# Altium footprint library Active.PcbLib: 325 footprints (part 19 of 23)
Each footprint in its own frame and in the unit in brackets; x right, y up, seen from the top. Pads: shape width x height; smd on the part's side, far side on the other; paste and mask are expansions set on the pad; w line width, h text height; cw(c..) or ccw(c..) is an arc to the next point about the centre after c.
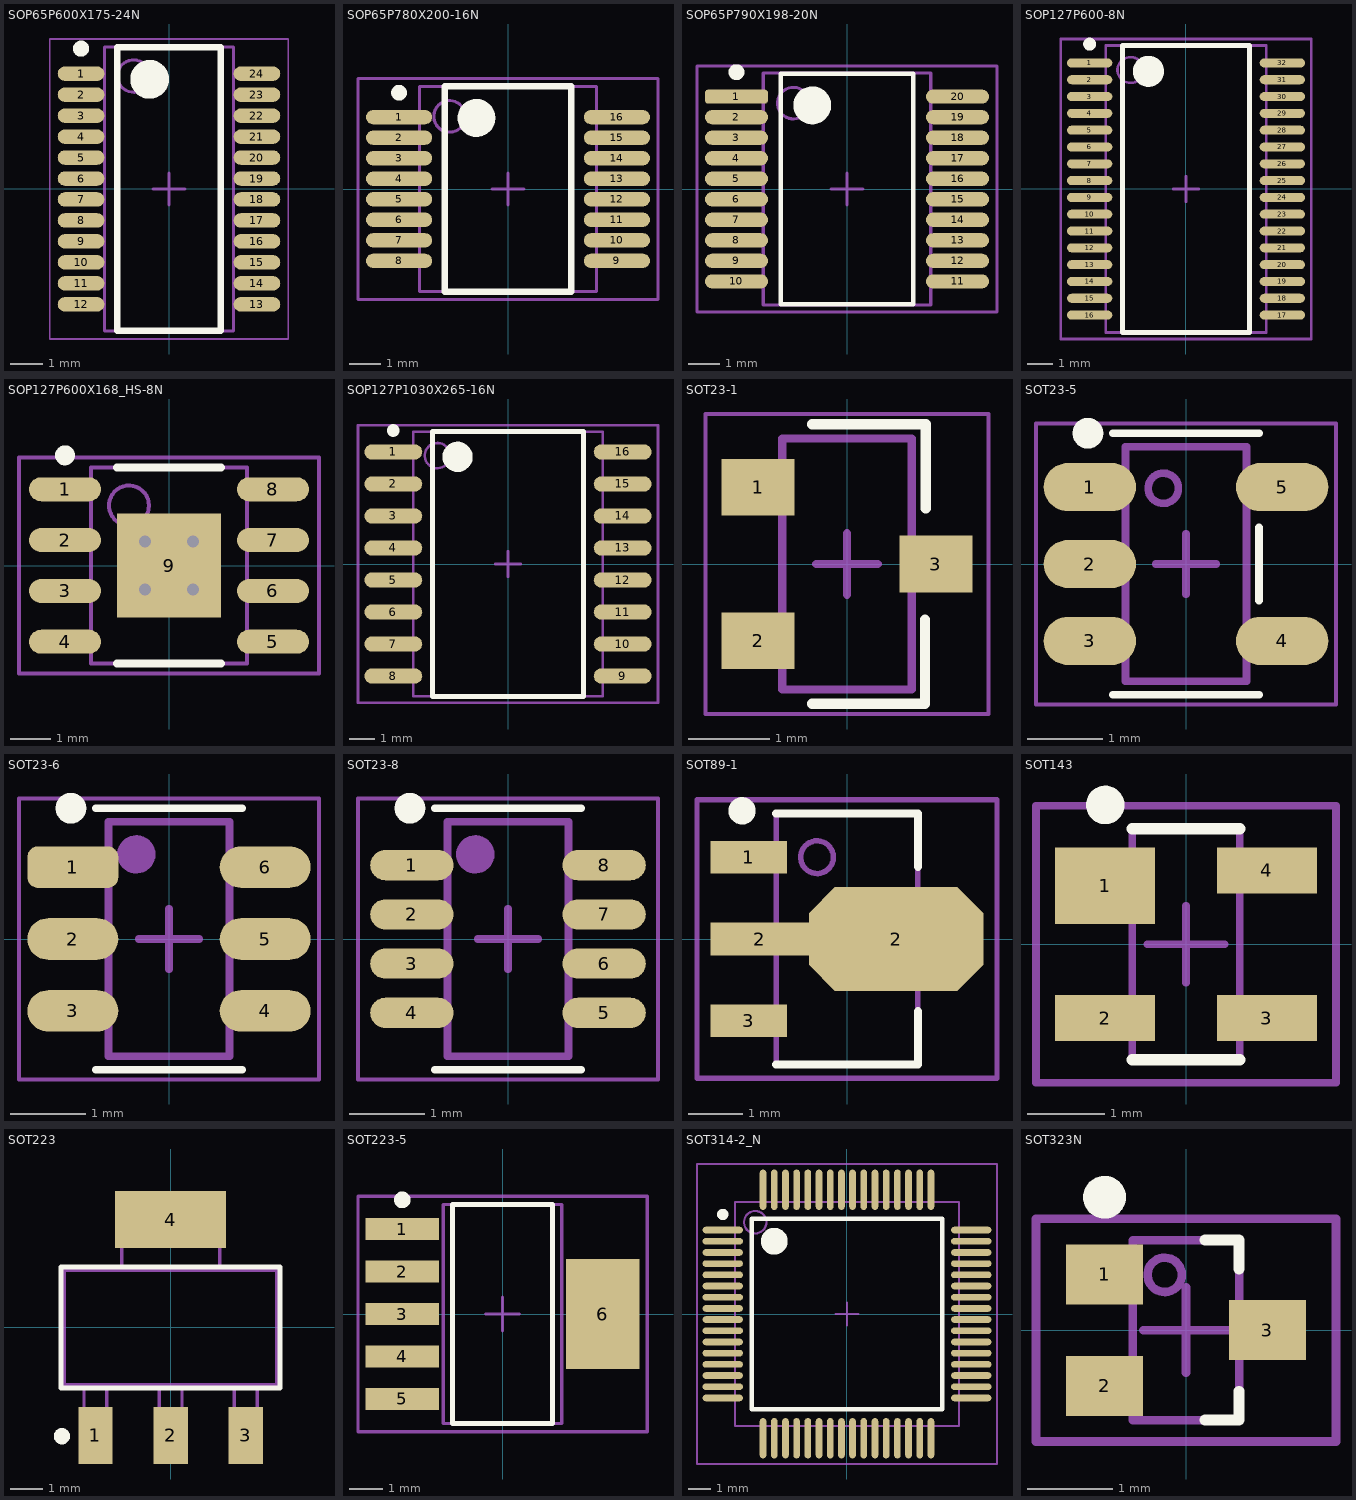
[diagram p18: the footprints below, top view; thin cyan lines are the x and y axes]

## SOP65P600X175-24N [mm] "SOP, 24-Leads, Body 8.65x3.90mm, Pitch 0.65mm, IPC Medium Density"
height 1.75
pads (24):
  oval 1.45x0.45 smd mask+0.05: 1(-2.725,3.575) 2(-2.725,2.925) 3(-2.725,2.275) 4(-2.725,1.625) 5(-2.725,0.975) 6(-2.725,0.325) 7(-2.725,-0.325) 8(-2.725,-0.975) 9(-2.725,-1.625) 10(-2.725,-2.275) 11(-2.725,-2.925) 12(-2.725,-3.575) 13(2.725,-3.575) 14(2.725,-2.925) 15(2.725,-2.275) 16(2.725,-1.625) 17(2.725,-0.975) 18(2.725,-0.325) 19(2.725,0.325) 20(2.725,0.975) 21(2.725,1.625) 22(2.725,2.275) 23(2.725,2.925) 24(2.725,3.575)
Top Overlay:
  circle w0.25: c-2.725,4.35 r0.125
  circle w0.6: c-0.6,3.4 r0.3
  lines w0.2: -1.6,-4.4 -1.6,4.4 1.6,4.4 1.6,-4.4 -1.6,-4.4
Mechanical 13:
  circle w0.1: c-1.1,3.5 r0.5
  lines w0.1: -2,-4.4 -2,4.4 2,4.4 2,-4.4 -2,-4.4
Mechanical 15:
  lines w0.05: -3.7,-4.65 -3.7,4.65 3.7,4.65 3.7,-4.65 -3.7,-4.65
  lines w0.1: -0.5,0 0.5,0 ; 0,-0.5 0,0.5
3D body: height 1.75, standoff 0.1, extent -2,-4.4 2,4.4
3D body: height 1.76, standoff 1.75, extent -1.599,3 -0.6,4

## SOP65P780X200-16N [mm] "SOP, 16-Leads, Body 6,5x5,6mm (max), Pitch 0,65mm, IPC Medium Density"
height 2
pads (16):
  oval 2.1x0.45 smd mask+0.051: 1(-3.45,2.275) 2(-3.45,1.625) 3(-3.45,0.975) 4(-3.45,0.325) 5(-3.45,-0.325) 6(-3.45,-0.975) 7(-3.45,-1.625) 8(-3.45,-2.275) 9(3.45,-2.275) 10(3.45,-1.625) 11(3.45,-0.975) 12(3.45,-0.325) 13(3.45,0.325) 14(3.45,0.975) 15(3.45,1.625) 16(3.45,2.275)
Top Overlay:
  circle w0.6: c-1,2.25 r0.3
  circle w0.25: c-3.45,3.05 r0.125
  lines w0.2: -2,-3.25 2,-3.25 2,3.25 -2,3.25 -2,-3.25
Mechanical 13:
  circle w0.1: c-1.85,2.3 r0.5
  lines w0.1: -2.8,-3.25 2.8,-3.25 2.8,3.25 -2.8,3.25 -2.8,-3.25
Mechanical 15:
  lines w0.1: -0.5,0 0.5,0 ; 0,-0.5 0,0.5 ; -4.75,-3.5 4.75,-3.5 4.75,3.5 -4.75,3.5 -4.75,-3.5
3D body: height 2, standoff 0.05, extent -2.8,-3.25 2.8,3.25

## SOP65P790X198-20N [mm] "SOP, 20-Leads, Body 7,3x5,3mm (max), Pitch 0,65mm, IPC Medium Density"
height 1.98
pads (20):
  rrect50% 2x0.45 smd mask+0.051: 1(-3.5,2.925)
  oval 2x0.45 smd mask+0.051: 2(-3.5,2.275) 3(-3.5,1.625) 4(-3.5,0.975) 5(-3.5,0.325) 6(-3.5,-0.325) 7(-3.5,-0.975) 8(-3.5,-1.625) 9(-3.5,-2.275) 10(-3.5,-2.925) 11(3.5,-2.925) 12(3.5,-2.275) 13(3.5,-1.625) 14(3.5,-0.975) 15(3.5,-0.325) 16(3.5,0.325) 17(3.5,0.975) 18(3.5,1.625) 19(3.5,2.275) 20(3.5,2.925)
Top Overlay:
  circle w0.6: c-1.1,2.65 r0.3
  circle w0.25: c-3.5,3.7 r0.125
  lines w0.15: -2.1,-3.65 2.1,-3.65 2.1,3.65 -2.1,3.65 -2.1,-3.65
Mechanical 13:
  circle w0.1: c-1.7,2.72 r0.5
  lines w0.1: -2.65,-3.67 2.65,-3.67 2.65,3.67 -2.65,3.67 -2.65,-3.67
Mechanical 15:
  lines w0.1: -0.5,0 0.5,0 ; 0,-0.5 0,0.5 ; -4.75,-3.9 4.75,-3.9 4.75,3.9 -4.75,3.9 -4.75,-3.9
3D body: height 1.98, standoff 0.15, extent -2.65,-3.67 2.65,3.67

## SOP127P600-8N [mm]
height 1.2
pads (32):
  oval 1.75x0.35 smd mask+0.051: 1(-3.725,4.875) 2(-3.725,4.225) 3(-3.725,3.575) 4(-3.725,2.925) 5(-3.725,2.275) 6(-3.725,1.625) 7(-3.725,0.975) 8(-3.725,0.325) 9(-3.725,-0.325) 10(-3.725,-0.975) 11(-3.725,-1.625) 12(-3.725,-2.275) 13(-3.725,-2.925) 14(-3.725,-3.575) 15(-3.725,-4.225) 16(-3.725,-4.875) 17(3.725,-4.875) 18(3.725,-4.225) 19(3.725,-3.575) 20(3.725,-2.925) 21(3.725,-2.275) 22(3.725,-1.625) 23(3.725,-0.975) 24(3.725,-0.325) 25(3.725,0.325) 26(3.725,0.975) 27(3.725,1.625) 28(3.725,2.275) 29(3.725,2.925) 30(3.725,3.575) 31(3.725,4.225) 32(3.725,4.875)
Top Overlay:
  circle w0.6: c-1.45,4.55 r0.3
  circle w0.25: c-3.725,5.6 r0.125
  lines w0.2: -2.45,-5.55 2.45,-5.55 2.45,5.55 -2.45,5.55 -2.45,-5.55
Mechanical 13:
  circle w0.1: c-2.15,4.6 r0.5
  lines w0.1: -3.1,-5.55 3.1,-5.55 3.1,5.55 -3.1,5.55 -3.1,-5.55
Mechanical 15:
  lines w0.1: -0.5,0 0.5,0 ; 0,-0.5 0,0.5 ; -4.85,-5.8 4.85,-5.8 4.85,5.8 -4.85,5.8 -4.85,-5.8
3D body: height 1.2, standoff 0.1, extent -3.1,-5.55 3.1,5.55

## SOP127P600X168_HS-8N [mm] "SOP, 8-Leads, Body 4,9x3,9mm (max), Pitch 1,27mm, IPC Medium Density"
height 1.68
pads (9):
  oval 1.8x0.6 smd mask+0.076: 1(-2.6,1.905) 2(-2.6,0.635) 3(-2.6,-0.635) 4(-2.6,-1.905) 5(2.6,-1.905) 6(2.6,-0.635) 7(2.6,0.635) 8(2.6,1.905)
  rect 2.6x2.6 smd paste-7 mask-7: 9(0,0)
via 0.6,-0.6 diameter 0.65 hole 0.3
via -0.6,-0.6 diameter 0.65 hole 0.3
via 0.6,0.6 diameter 0.65 hole 0.3
via -0.6,0.6 diameter 0.65 hole 0.3
Top Overlay:
  circle w0.25: c-2.6,2.755 r0.125
  lines w0.2: -1.3,-2.45 1.3,-2.45 ; -1.3,2.45 1.3,2.45
Top Paste:
  region: -0.525,0.275 -0.525,-0.275 -0.275,-0.525 0.275,-0.525 0.275,-0.5 0.5,-0.275 0.5,0.275 0.275,0.5 -0.3,0.5
  region: -1.3,-0.5 -0.925,-0.5 -0.7,-0.275 -0.7,0.275 -0.925,0.5 -1.3,0.5
  region: 1.3,-0.5 0.925,-0.5 0.7,-0.275 0.7,0.275 0.925,0.5 1.3,0.5
  region: -0.5,-1.3 -0.5,-0.925 -0.275,-0.7 0.275,-0.7 0.5,-0.925 0.5,-1.3
  region: -0.5,1.3 -0.5,0.925 -0.275,0.7 0.275,0.7 0.5,0.925 0.5,1.3
  region: -1.3,-1.3 -0.675,-1.3 -0.675,-0.925 -0.95,-0.65 -1.3,-0.65
  region: 1.3,-1.3 0.675,-1.3 0.675,-0.925 0.95,-0.65 1.3,-0.65
  region: 1.3,1.3 0.675,1.3 0.675,0.925 0.95,0.65 1.3,0.65
  region: -1.3,1.3 -0.675,1.3 -0.675,0.925 -0.95,0.65 -1.3,0.65
Top Solder:
  circle w0.102: c-0.6,0.6 r0.406
  circle w0.102: c0.6,0.6 r0.406
  circle w0.102: c-0.6,-0.6 r0.406
  circle w0.102: c0.6,-0.6 r0.406
  region: -1.346,-1.397 0,-1.397 0,0 -0.635,0 -0.635,-0.203 -0.483,-0.203 -0.457,-0.229 -0.381,-0.229 -0.305,-0.305 -0.305,-0.356 -0.194,-0.467 -0.194,-0.727 -0.279,-0.813 -0.279,-0.838 -0.432,-0.991 -0.559,-0.991 -0.584,-1.016 -0.61,-0.991 -0.787,-0.991 -0.94,-0.838 -0.965,-0.838 -0.965,-0.711 -0.991,-0.686 -0.991,-0.432 -0.914,-0.356 -0.914,-0.33 -0.787,-0.203 -0.686,-0.203 -0.66,-0.178 -0.635,-0.178 -0.635,0 -1.346,0
  region: 1.346,-1.397 0,-1.397 0,0 0.635,0 0.635,-0.203 0.483,-0.203 0.457,-0.229 0.381,-0.229 0.305,-0.305 0.305,-0.356 0.194,-0.467 0.194,-0.727 0.279,-0.813 0.279,-0.838 0.432,-0.991 0.559,-0.991 0.584,-1.016 0.61,-0.991 0.787,-0.991 0.94,-0.838 0.965,-0.838 0.965,-0.711 0.991,-0.686 0.991,-0.432 0.914,-0.356 0.914,-0.33 0.787,-0.203 0.686,-0.203 0.66,-0.178 0.635,-0.178 0.635,0 1.346,0
  region: 1.346,1.397 0,1.397 0,0 0.635,0 0.635,0.203 0.483,0.203 0.457,0.229 0.381,0.229 0.305,0.305 0.305,0.356 0.194,0.467 0.194,0.727 0.279,0.813 0.279,0.838 0.432,0.991 0.559,0.991 0.584,1.016 0.61,0.991 0.787,0.991 0.94,0.838 0.965,0.838 0.965,0.711 0.991,0.686 0.991,0.432 0.914,0.356 0.914,0.33 0.787,0.203 0.686,0.203 0.66,0.178 0.635,0.178 0.635,0 1.346,0
  region: -1.346,1.397 0,1.397 0,0 -0.635,0 -0.635,0.203 -0.483,0.203 -0.457,0.229 -0.381,0.229 -0.305,0.305 -0.305,0.356 -0.194,0.467 -0.194,0.727 -0.279,0.813 -0.279,0.838 -0.432,0.991 -0.559,0.991 -0.584,1.016 -0.61,0.991 -0.787,0.991 -0.94,0.838 -0.965,0.838 -0.965,0.711 -0.991,0.686 -0.991,0.432 -0.914,0.356 -0.914,0.33 -0.787,0.203 -0.686,0.203 -0.66,0.178 -0.635,0.178 -0.635,0 -1.346,0
Mechanical 13:
  circle w0.1: c-1,1.5 r0.5
  lines w0.1: -1.95,-2.45 1.95,-2.45 1.95,2.45 -1.95,2.45 -1.95,-2.45
Mechanical 15:
  lines w0.1: -0.5,0 0.5,0 ; 0,-0.5 0,0.5 ; -3.75,-2.7 3.75,-2.7 3.75,2.7 -3.75,2.7 -3.75,-2.7
3D body: height 1.78, standoff 1.68, extent -1.5,1.025 -0.504,2.023
3D body: height 1.68, standoff 0.13, extent -1.95,-2.45 1.95,2.45

## SOP127P1030X265-16N [mm] "SOP, 16-Leads, Body 10,5x7,5mm (max), Pitch 1,27mm, IPC Medium Density"
height 2.65
pads (16):
  oval 2.3x0.6 smd: 1(-4.55,4.445) 2(-4.55,3.175) 3(-4.55,1.905) 4(-4.55,0.635) 5(-4.55,-0.635) 6(-4.55,-1.905) 7(-4.55,-3.175) 8(-4.55,-4.445) 9(4.55,-4.445) 10(4.55,-3.175) 11(4.55,-1.905) 12(4.55,-0.635) 13(4.55,0.635) 14(4.55,1.905) 15(4.55,3.175) 16(4.55,4.445)
Top Overlay:
  circle w0.6: c-2,4.25 r0.3
  circle w0.25: c-4.55,5.295 r0.125
  lines w0.2: -3,-5.25 3,-5.25 3,5.25 -3,5.25 -3,-5.25
Mechanical 13:
  circle w0.1: c-2.8,4.3 r0.5
  lines w0.1: -3.75,-5.25 3.75,-5.25 3.75,5.25 -3.75,5.25 -3.75,-5.25
Mechanical 15:
  lines w0.1: -0.5,0 0.5,0 ; 0,-0.5 0,0.5 ; -5.95,-5.5 5.95,-5.5 5.95,5.5 -5.95,5.5 -5.95,-5.5
3D body: height 2.65, standoff 0.1, extent -3.75,-5.25 3.75,5.25

## SOT23-1 [mm]
height 1.016
pads (3):
  rect 0.9x0.7 smd: 1(-1.1,0.95) 2(-1.1,-0.95) 3(1.1,0)
Top Overlay:
  lines w0.127: -0.432,-1.727 0.965,-1.727 0.965,-0.689 ; -0.432,1.727 0.975,1.727 0.975,0.686
Mechanical 13:
  lines w0.102: -0.8,-1.55 -0.8,1.55 0.8,1.55 0.8,-1.55 -0.8,-1.55
Mechanical 15:
  lines w0.051: -1.75,-1.854 -1.75,1.854 1.75,1.854 1.75,-1.854 -1.75,-1.854
  lines w0.102: -0.381,0 0.381,0 ; 0,-0.381 0,0.381
3D body: height 0.3, standoff 0, extent 0.8,-0.225 1.275,0.225
3D body: height 0.3, standoff 0, extent -1.275,-1.175 -0.8,-0.725
3D body: height 0.3, standoff 0, extent -1.275,0.725 -0.8,1.175
3D body: height 1.02, standoff 0, extent -0.8,-1.55 0.8,1.55

## SOT23-5 [mil]
height 40
pads (5):
  oval 48x25 smd mask+2: 1(-50,40) 2(-50,0) 3(-50,-40) 4(50,-40) 5(50,40)
Top Overlay:
  circle w8: c-51,68 r4
  lines w4: -38,-68 38,-68 ; -38,68 38,68 ; 38,-19 38,19
Mechanical 13:
  circle w3.94: c-11.81,39.37 r7.87
  lines w4: -31.5,-61.02 31.5,-61.02 31.5,61.02 -31.5,61.02 -31.5,-61.02
Mechanical 15:
  lines w2: -78,-73 78,-73 78,73 -78,73 -78,-73
  lines w4: -15.75,0 15.75,0 ; 0,-15.75 0,15.75
3D body: height 11.81, standoff 0, extent 31.5,-48.23 50.2,-30.51
3D body: height 11.81, standoff 0, extent 31.5,30.51 50.2,48.23
3D body: height 11.81, standoff 0, extent -50.2,-8.86 -31.5,8.86
3D body: height 11.81, standoff 0, extent -50.2,-48.23 -31.5,-30.51
3D body: height 11.81, standoff 0, extent -50.2,30.51 -31.5,48.23
3D body: height 57.09, standoff 0, extent -31.5,-61.02 31.5,61.02
3D body: height 57.48, standoff 57.09, extent -19.68,31.5 -3.94,47.24

## SOT23-6 [mm]
height 1.016
pads (6):
  rrect50% 1.2x0.55 smd mask+0.051: 1(-1.27,0.95)
  oval 1.2x0.55 smd mask+0.051: 2(-1.27,0) 3(-1.27,-0.95) 4(1.27,-0.95) 5(1.27,0) 6(1.27,0.95)
Top Overlay:
  circle w0.203: c-1.295,1.727 r0.102
  lines w0.102: -0.965,-1.727 0.965,-1.727 ; -0.965,1.727 0.965,1.727
Mechanical 13:
  circle w0.1: c-0.432,1.118 r0.051
  circle w0.1: c-0.432,1.118 r0.127
  circle w0.1: c-0.432,1.118 r0.203
  lines w0.102: -0.8,-1.55 0.8,-1.55 0.8,1.55 -0.8,1.55 -0.8,-1.55
Mechanical 15:
  lines w0.051: -1.981,-1.854 1.981,-1.854 1.981,1.854 -1.981,1.854 -1.981,-1.854
  lines w0.102: -0.4,0 0.4,0 ; 0,-0.4 0,0.4
3D body: height 0.2, standoff 0, extent 0.975,-1.175 1.5,-0.725
3D body: height 0.8, standoff 0.6, extent 0.8,-1.175 1.175,-0.725
3D body: height 0.6, standoff 0.2, extent 0.975,-1.175 1.175,-0.725
3D body: height 0.6, standoff 0.2, extent 0.975,-0.225 1.175,0.225
3D body: height 0.8, standoff 0.6, extent 0.8,-0.225 1.175,0.225
3D body: height 0.2, standoff 0, extent 0.975,-0.225 1.5,0.225
3D body: height 0.6, standoff 0.2, extent 0.975,0.725 1.175,1.175
3D body: height 0.8, standoff 0.6, extent 0.8,0.725 1.175,1.175
3D body: height 0.2, standoff 0, extent 0.975,0.725 1.5,1.175
3D body: height 0.2, standoff 0, extent -1.5,-1.175 -0.975,-0.725
3D body: height 0.8, standoff 0.6, extent -1.175,-1.175 -0.8,-0.725
3D body: height 0.6, standoff 0.2, extent -1.175,-1.175 -0.975,-0.725
3D body: height 0.2, standoff 0, extent -1.5,-0.225 -0.975,0.225
3D body: height 0.8, standoff 0.6, extent -1.175,-0.225 -0.8,0.225
3D body: height 0.6, standoff 0.2, extent -1.175,-0.225 -0.975,0.225
3D body: height 0.6, standoff 0.2, extent -1.175,0.725 -0.975,1.175
3D body: height 0.8, standoff 0.6, extent -1.175,0.725 -0.8,1.175
3D body: height 0.2, standoff 0, extent -1.5,0.725 -0.975,1.175
3D body: height 1.46, standoff 1.45, extent -0.65,0.9 -0.2,1.35
3D body: height 1.45, standoff 0, extent -0.8,-1.55 0.8,1.55

## SOT23-8 [mm]
height 1.016
pads (8):
  oval 1.1x0.4 smd mask+0.051: 1(-1.27,0.975) 2(-1.27,0.325) 3(-1.27,-0.325) 4(-1.27,-0.975) 5(1.27,-0.975) 6(1.27,-0.325) 7(1.27,0.325) 8(1.27,0.975)
Top Overlay:
  circle w0.203: c-1.295,1.727 r0.102
  lines w0.102: -0.965,-1.727 0.965,-1.727 ; -0.965,1.727 0.965,1.727
Mechanical 13:
  circle w0.1: c-0.432,1.118 r0.203
  circle w0.1: c-0.432,1.118 r0.127
  circle w0.1: c-0.432,1.118 r0.051
  lines w0.102: -0.8,-1.55 -0.8,1.55 0.8,1.55 0.8,-1.55 -0.8,-1.55
Mechanical 15:
  lines w0.051: -1.981,-1.854 -1.981,1.854 1.981,1.854 1.981,-1.854 -1.981,-1.854
  lines w0.102: -0.4,0 0.4,0 ; 0,-0.4 0,0.4
3D body: height 0.2, standoff 0, extent 0.975,0.75 1.4,1.2
3D body: height 0.8, standoff 0.2, extent 0.975,0.75 1.175,1.2
3D body: height 0.9, standoff 0.7, extent 0.8,0.75 1.175,1.2
3D body: height 0.2, standoff 0, extent 0.975,0.1 1.4,0.55
3D body: height 0.8, standoff 0.2, extent 0.975,0.1 1.175,0.55
3D body: height 0.9, standoff 0.7, extent 0.8,0.1 1.175,0.55
3D body: height 0.2, standoff 0, extent 0.975,-0.55 1.4,-0.1
3D body: height 0.8, standoff 0.2, extent 0.975,-0.55 1.175,-0.1
3D body: height 0.9, standoff 0.7, extent 0.8,-0.55 1.175,-0.1
3D body: height 0.2, standoff 0, extent 0.975,-1.2 1.4,-0.75
3D body: height 0.8, standoff 0.2, extent 0.975,-1.2 1.175,-0.75
3D body: height 0.9, standoff 0.7, extent 0.8,-1.2 1.175,-0.75
3D body: height 0.2, standoff 0, extent -1.4,-1.2 -0.975,-0.75
3D body: height 0.8, standoff 0.2, extent -1.175,-1.2 -0.975,-0.75
3D body: height 0.9, standoff 0.7, extent -1.175,-1.2 -0.8,-0.75
3D body: height 0.2, standoff 0, extent -1.4,-0.55 -0.975,-0.1
3D body: height 0.8, standoff 0.2, extent -1.175,-0.55 -0.975,-0.1
3D body: height 0.9, standoff 0.7, extent -1.175,-0.55 -0.8,-0.1
3D body: height 0.2, standoff 0, extent -1.4,0.1 -0.975,0.55
3D body: height 0.8, standoff 0.2, extent -1.175,0.1 -0.975,0.55
3D body: height 0.9, standoff 0.7, extent -1.175,0.1 -0.8,0.55
3D body: height 0.9, standoff 0.7, extent -1.175,0.75 -0.8,1.2
3D body: height 0.8, standoff 0.2, extent -1.175,0.75 -0.975,1.2
3D body: height 1.45, standoff 0.15, extent -0.8,-1.55 0.8,1.55
3D body: height 1.46, standoff 1.45, extent -0.65,0.9 -0.2,1.35
3D body: height 0.2, standoff 0, extent -1.4,0.75 -0.975,1.2

## SOT89-1 [mm] "SOT89 3-Leads 4,5x2,4mm R1,50mm"
height 1.6
pads (4):
  rect 1.4x0.6 smd: 1(-1.8,1.5) 3(-1.8,-1.5)
  rect 1.8x0.6 smd: 2(-1.6,0)
  oct 3.2x1.9 smd: 2(0.9,0)
Top Overlay:
  circle w0.25: c-1.925,2.35 r0.125
  lines w0.15: -1.3,-2.3 1.3,-2.3 1.3,-1.325 ; -1.3,2.3 1.3,2.3 1.3,1.325
Mechanical 13:
  circle w0.1: c-0.55,1.5 r0.3
  lines w0.1: -1.3,-2.3 -1.3,2.3 1.3,2.3 1.3,-2.3 -1.3,-2.3
  lines w0.102: -1.3,-1.7 -2.175,-1.7 -2.175,-1.3 -1.3,-1.3 ; -1.3,-0.2 -2.175,-0.2 -2.175,0.2 -1.3,0.2 ; -1.3,1.3 -2.175,1.3 -2.175,1.7 -1.3,1.7 ; 1.3,-0.825 1.95,-0.825 2.375,-0.4 2.375,0.4 1.95,0.825 1.3,0.825
Mechanical 15:
  lines w0.1: -0.5,0 0.5,0 ; 0,-0.5 0,0.5 ; -2.75,-2.55 -2.75,2.55 2.75,2.55 2.75,-2.55 -2.75,-2.55
3D body: height 1.61, standoff 1.6, extent -0.85,1.2 -0.25,1.8
3D body: height 1.6, standoff 0, extent -1.3,-2.3 1.3,2.3
3D body: height 0.3, standoff 0, extent -2.175,-1.7 -1.3,-1.3
3D body: height 0.3, standoff 0, extent -2.175,-0.2 -1.3,0.2
3D body: height 0.3, standoff 0, extent -2.175,1.3 -1.3,1.7
3D body: height 0.3, standoff 0, extent 1.3,-0.825 2.375,0.825

## SOT143 [mm] "SOT143, 4-Leads, Body 3,0x1.3mm, Pitch 1,92mm, IPC Medium Density"
height 1.2
pads (4):
  rect 1.3x1 smd: 1(-1.05,0.76)
  rect 1.3x0.6 smd: 2(-1.05,-0.96) 3(1.05,-0.96) 4(1.05,0.96)
Top Overlay:
  circle w0.25: c-1.05,1.81 r0.125
  lines w0.15: -0.7,-1.5 0.7,-1.5 ; -0.7,1.5 0.7,1.5
Mechanical 13:
  lines w0.1: -0.7,-1.52 -0.7,1.52 0.7,1.52 0.7,-1.52 -0.7,-1.52
  lines w0.102: -0.75,-0.8 -1.3,-0.8 -1.3,-1.125 -0.7,-1.125 ; -0.7,0.4 -1.3,0.4 -1.3,1.125 -0.7,1.125 ; 0.7,-1.125 1.3,-1.125 1.3,-0.8 0.75,-0.8 ; 0.7,0.8 1.3,0.8 1.3,1.125 0.7,1.125
Mechanical 15:
  lines w0.1: -0.5,0 0.5,0 ; 0,-0.5 0,0.5 ; -1.95,-1.8 -1.95,1.8 1.95,1.8 1.95,-1.8 -1.95,-1.8
3D body: height 0.75, standoff 0.2, extent 0.7,0.8 0.95,1.125
3D body: height 0.75, standoff 0.2, extent 0.7,-1.125 0.95,-0.8
3D body: height 0.75, standoff 0.2, extent -0.95,-1.125 -0.7,-0.8
3D body: height 0.75, standoff 0.2, extent -0.95,0.4 -0.7,1.125
3D body: height 1.2, standoff 0.15, extent -0.7,-1.52 0.7,1.52
3D body: height 0.2, standoff 0, extent -1.3,0.4 -0.7,1.125
3D body: height 0.2, standoff 0, extent -1.3,-1.125 -0.7,-0.8
3D body: height 0.2, standoff 0, extent 0.7,-1.125 1.3,-0.8
3D body: height 0.2, standoff 0, extent 0.7,0.8 1.3,1.125

## SOT223 [mm]
height 1.8
pads (4):
  rect 1.05x1.75 smd: 1(-2.3,-3.3) 2(0,-3.3) 3(2.3,-3.3)
  rect 3.4x1.75 smd: 4(0,3.3)
Top Overlay:
  circle w0.25: c-3.325,-3.325 r0.125
  lines w0.152: -3.35,-1.85 -3.35,1.85 3.35,1.85 3.35,-1.85 -3.35,-1.85
Mechanical 13:
  lines w0.102: -2.65,-1.75 -2.65,-3.5 -1.95,-3.5 -1.95,-1.75 ; -1.5,1.75 -1.5,3.5 1.5,3.5 1.5,1.75 ; -0.35,-1.75 -0.35,-3.5 0.35,-3.5 0.35,-1.75 ; 1.95,-1.75 1.95,-3.5 2.65,-3.5 2.65,-1.75 ; -3.25,-1.75 3.25,-1.75 3.25,1.75 -3.25,1.75 -3.25,-1.75
3D body: height 1, standoff 0.8, extent -1.5,1.75 1.5,2.75
3D body: height 1, standoff 0, extent -1.5,2.55 1.5,2.75
3D body: height 0.2, standoff 0, extent -1.5,2.75 1.5,3.5
3D body: height 1, standoff 0.8, extent 1.95,-2.75 2.65,-1.75
3D body: height 1, standoff 0, extent 1.95,-2.75 2.65,-2.55
3D body: height 0.2, standoff 0, extent 1.95,-3.5 2.65,-2.75
3D body: height 1, standoff 0.8, extent -0.35,-2.75 0.35,-1.75
3D body: height 1, standoff 0, extent -0.35,-2.75 0.35,-2.55
3D body: height 0.2, standoff 0, extent -0.35,-3.5 0.35,-2.75
3D body: height 0.2, standoff 0, extent -2.65,-3.5 -1.95,-2.75
3D body: height 1, standoff 0, extent -2.65,-2.75 -1.95,-2.55
3D body: height 1, standoff 0.8, extent -2.65,-2.75 -1.95,-1.75
3D body: height 1.8, standoff 0, extent -3.25,-1.75 3.25,1.75

## SOT223-5 [mm] "SOT223, 5+1 Leads, Body 6,6x7,3mm (max), Pitch 1,27mm, IPC Medium Density"
height 1.8
pads (6):
  rect 2.2x0.65 smd: 1(-3,2.54) 2(-3,1.27) 3(-3,0) 4(-3,-1.27) 5(-3,-2.54)
  rect 2.2x3.3 smd: 6(3,0)
Top Overlay:
  circle w0.25: c-3,3.415 r0.125
  lines w0.15: -1.5,-3.275 1.5,-3.275 1.5,3.275 -1.5,3.275 -1.5,-3.275
Mechanical 13:
  lines w0.1: -1.775,-3.275 1.775,-3.275 1.775,3.275 -1.775,3.275 -1.775,-3.275
Mechanical 15:
  lines w0.1: -0.5,0 0.5,0 ; 0,-0.5 0,0.5 ; -4.325,-3.525 4.325,-3.525 4.325,3.525 -4.325,3.525 -4.325,-3.525
3D body: height 1.8, standoff 0.02, extent -1.775,-3.275 1.775,3.275

## SOT314-2_N [mm] "Thin QFP, 64-Leads, Body 10x10mm, Pitch 0.5mm, IPC Medium Density"
height 1.6
pads (64):
  oval 1.8x0.3 smd mask+0.051: 1(-5.55,3.75) 2(-5.55,3.25) 3(-5.55,2.75) 4(-5.55,2.25) 5(-5.55,1.75) 6(-5.55,1.25) 7(-5.55,0.75) 8(-5.55,0.25) 9(-5.55,-0.25) 10(-5.55,-0.75) 11(-5.55,-1.25) 12(-5.55,-1.75) 13(-5.55,-2.25) 14(-5.55,-2.75) 15(-5.55,-3.25) 16(-5.55,-3.75) 33(5.55,-3.75) 34(5.55,-3.25) 35(5.55,-2.75) 36(5.55,-2.25) 37(5.55,-1.75) 38(5.55,-1.25) 39(5.55,-0.75) 40(5.55,-0.25) 41(5.55,0.25) 42(5.55,0.75) 43(5.55,1.25) 44(5.55,1.75) 45(5.55,2.25) 46(5.55,2.75) 47(5.55,3.25) 48(5.55,3.75)
  oval 0.3x1.8 smd mask+0.051: 17(-3.75,-5.55) 18(-3.25,-5.55) 19(-2.75,-5.55) 20(-2.25,-5.55) 21(-1.75,-5.55) 22(-1.25,-5.55) 23(-0.75,-5.55) 24(-0.25,-5.55) 25(0.25,-5.55) 26(0.75,-5.55) 27(1.25,-5.55) 28(1.75,-5.55) 29(2.25,-5.55) 30(2.75,-5.55) 31(3.25,-5.55) 32(3.75,-5.55) 49(3.75,5.55) 50(3.25,5.55) 51(2.75,5.55) 52(2.25,5.55) 53(1.75,5.55) 54(1.25,5.55) 55(0.75,5.55) 56(0.25,5.55) 57(-0.25,5.55) 58(-0.75,5.55) 59(-1.25,5.55) 60(-1.75,5.55) 61(-2.25,5.55) 62(-2.75,5.55) 63(-3.25,5.55) 64(-3.75,5.55)
Top Overlay:
  circle w0.6: c-3.25,3.25 r0.3
  circle w0.25: c-5.55,4.45 r0.125
  lines w0.2: -4.25,-4.25 4.25,-4.25 4.25,4.25 -4.25,4.25 -4.25,-4.25
Mechanical 13:
  circle w0.1: c-4.1,4.1 r0.5
  lines w0.1: -5,-5 5,-5 5,5 -5,5 -5,-5
Mechanical 15:
  lines w0.1: -0.5,0 0.5,0 ; 0,-0.5 0,0.5 ; -6.7,-6.7 6.7,-6.7 6.7,6.7 -6.7,6.7 -6.7,-6.7
3D body: height 1.61, standoff 1.6, extent -4.6,3.6 -3.6,4.6
3D body: height 1.6, standoff 0, extent -5,-5 5,5

## SOT323N [mm] "SOT323 medium density (SC70)"
height 0.9
pads (3):
  rect 0.9x0.7 smd: 1(-0.95,0.65) 2(-0.95,-0.65) 3(0.95,0)
Top Overlay:
  circle w0.25: c-0.95,1.55 r0.125
  lines w0.127: 0.22,-1.05 0.62,-1.05 0.62,-0.713 ; 0.22,1.05 0.62,1.05 0.62,0.714
Mechanical 13:
  circle w0.1: c-0.249,0.644 r0.2
  lines w0.1: -0.62,-1.05 -0.62,1.05 0.62,1.05 0.62,-1.05 -0.62,-1.05
Mechanical 15:
  lines w0.1: -0.5,0 0.5,0 ; 0,-0.5 0,0.5 ; -1.75,-1.3 -1.75,1.3 1.75,1.3 1.75,-1.3 -1.75,-1.3
3D body: height 0.91, standoff 0.9, extent -0.449,0.444 -0.049,0.844
3D body: height 0.9, standoff 0.1, extent -0.62,-1.05 0.62,1.05
3D body: height 0.3, standoff 0, extent 0.62,-0.225 1.095,0.225
3D body: height 0.3, standoff 0, extent -1.095,0.41 -0.62,0.86
3D body: height 0.3, standoff 0, extent -1.095,-0.86 -0.62,-0.41